# Altium footprint library MYS-Library.PcbLib: 94 footprints (part 6 of 6)
Each footprint in its own frame and in the unit in brackets; x right, y up, seen from the top. Pads: shape width x height; smd on the part's side, far side on the other; paste and mask are expansions set on the pad; w line width, h text height; cw(c..) or ccw(c..) is an arc to the next point about the centre after c.
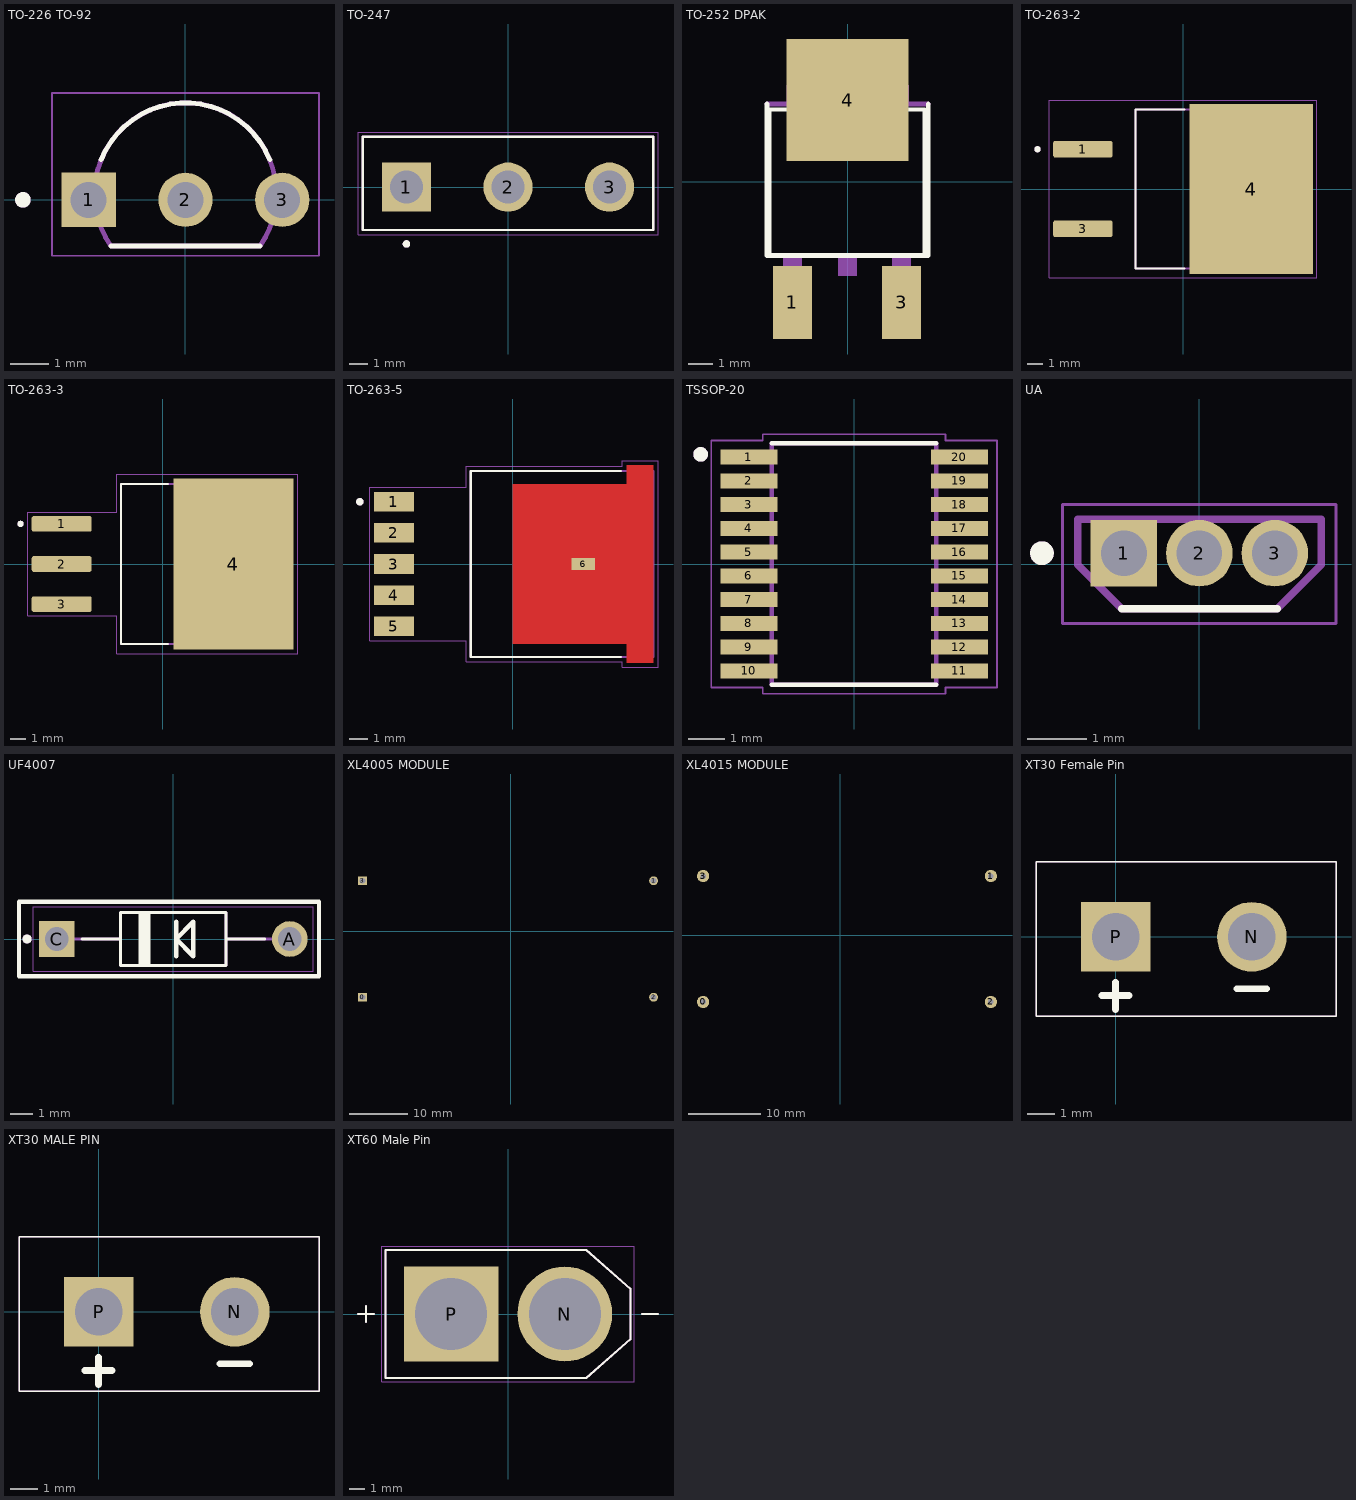
[diagram p5: the footprints below, top view; thin cyan lines are the x and y axes]

## TO-226 TO-92 [mm]
pads (3):
  rect 1.4x1.4 / inner round 1.4 / far side rect 1.4x1.4 hole 0.93: 1(-2.5,0)
  round 1.4 hole 0.93: 2(0,0) 3(2.5,0)
Top Overlay:
  circle w0.2: c-4.2,0 r0.1
  lines w0.127: -2.179,1.035 cw(c0,0.155) 2.179,1.035 ; -1.924,-1.195 1.924,-1.195 -1.924,-1.195
Mechanical 13:
  circle w0.2: c-4.2,0 r0.1
  lines w0.127: -1.925,-1.193 cw(c0,0.155) 1.925,-1.193 ; -1.924,-1.195 1.924,-1.195
Mechanical 15:
  lines w0.05: -3.45,-1.445 -3.45,2.755 3.45,2.755 3.45,-1.445 -3.45,-1.445
3D body "BC547B.STEP": height 8.09, standoff -9.01, extent -2.74,-1.27 2.74,2.33

## TO-247 [mm]
pads (3):
  rect 2.64x2.64 hole 1.76: 1(-5.45,0)
  round 2.64 hole 1.76: 2(0,0) 3(5.45,0)
Top Overlay:
  circle w0.2: c-5.45,-3.05 r0.1
  lines w0.127: -7.8,-2.3 -7.8,2.7 7.8,2.7 7.8,-2.3 -7.8,-2.3
Mechanical 13:
  circle w0.2: c-5.45,-3.05 r0.1
  lines w0.127: -7.8,-2.3 -7.8,2.7 7.8,2.7 7.8,-2.3 -7.8,-2.3
Mechanical 15:
  lines w0.05: -8.05,-2.55 -8.05,2.95 8.05,2.95 8.05,-2.55 -8.05,-2.55
3D body "step_temp.STEP": height 25.1, standoff -10, extent -7.8,-2.3 7.8,2.7

## TO-252 DPAK [mil]
pads (3):
  rect 63x118 smd: 1(-89,-194) 3(87,-194)
  rect 196.85x196.85 smd: 4(0,132)
Top Overlay:
  lines w6: -97,117 -126,117 -126,-119 124,-119 124,117 97,117
  lines w8: -129.92,125.98 -129.92,-118.11 129.92,-118.11 129.92,125.98
Mechanical 13:
  region: 98.43,155.51 98.43,125.98 -98.43,125.98 -98.43,155.51 -64.96,177.17 64.96,177.17
  region: 102,-226 72,-226 72,-121 102,-121
  region: 15,-151 -15,-151 -15,-121 15,-121
  region: -74,-226 -104,-226 -104,-121 -74,-121
  region: 102,-226 72,-226 72,-121 102,-121
  region: 15,-151 -15,-151 -15,-121 15,-121
  region: -74,-226 -104,-226 -104,-121 -74,-121
  lines w6: -97,117 97,117
  lines w8: -129.92,125.98 129.92,125.98
  text "2" at -8,-112 h24
  text "3" at 78,-112 h24
  text "4" at -13,72.5 h24
  text "1" at -95,-112 h24
3D body "step_temp.STEP": height 99, standoff 0, extent -128.75,-195 128.75,195

## TO-263-2 [mm]
pads (3):
  rrect25% 3.78x1.06 smd: 1(-6.4,2.54) 3(-6.4,-2.54)
  rect 7.88x10.84 smd paste-6: 4(4.35,0)
Top Overlay:
  circle w0.2: c-9.29,2.54 r0.1
  lines w0.127: 0.09,-5.08 -3.043,-5.08 -3.043,5.08 0.09,5.08
Top Paste:
  region: 7.74,3.9 6.22,3.9 6.22,5.15 7.74,5.15
  region: 5.11,3.9 3.59,3.9 3.59,5.15 5.11,5.15
  region: 2.48,3.9 0.96,3.9 0.96,5.15 2.48,5.15
  region: 7.74,2.09 6.22,2.09 6.22,3.34 7.74,3.34
  region: 5.11,2.09 3.59,2.09 3.59,3.34 5.11,3.34
  region: 2.48,2.09 0.96,2.09 0.96,3.34 2.48,3.34
  region: 7.74,-5.15 6.22,-5.15 6.22,-3.9 7.74,-3.9
  region: 5.11,-5.15 3.59,-5.15 3.59,-3.9 5.11,-3.9
  region: 2.48,-5.15 0.96,-5.15 0.96,-3.9 2.48,-3.9
  region: 7.74,-3.34 6.22,-3.34 6.22,-2.09 7.74,-2.09
  region: 5.11,-3.34 3.59,-3.34 3.59,-2.09 5.11,-2.09
  region: 2.48,-3.34 0.96,-3.34 0.96,-2.09 2.48,-2.09
  region: 7.74,-1.53 6.22,-1.53 6.22,-0.28 7.74,-0.28
  region: 5.11,-1.53 3.59,-1.53 3.59,-0.28 5.11,-0.28
  region: 2.48,-1.53 0.96,-1.53 0.96,-0.28 2.48,-0.28
  region: 7.74,0.28 6.22,0.28 6.22,1.53 7.74,1.53
  region: 5.11,0.28 3.59,0.28 3.59,1.53 5.11,1.53
  region: 2.48,0.28 0.96,0.28 0.96,1.53 2.48,1.53
Mechanical 13:
  circle w0.2: c-9.29,2.54 r0.1
  lines w0.127: -3.043,-5.08 5.973,-5.08 5.973,5.08 -3.043,5.08 -3.043,-5.08
Mechanical 15:
  lines w0.05: -8.54,-5.67 8.54,-5.67 8.54,5.67 -8.54,5.67 -8.54,-5.67
3D body "step_temp.STEP": height 4.83, standoff -0.25, extent -7.62,-5.08 7.62,5.08

## TO-263-3 [mm]
pads (4):
  rrect25% 3.79x0.99 smd: 1(-6.4,2.54) 2(-6.4,0) 3(-6.4,-2.54)
  rect 7.62x10.84 smd paste-6: 4(4.48,0)
Top Overlay:
  circle w0.2: c-9,2.54 r0.1
  lines w0.127: 0.35,-5.08 -2.648,-5.08 -2.648,5.08 0.35,5.08
Top Paste:
  region: 2.665,-5.13 1.215,-5.13 1.215,-3.87 2.665,-3.87
  region: 2.665,-3.33 1.215,-3.33 1.215,-2.07 2.665,-2.07
  region: 2.665,-1.53 1.215,-1.53 1.215,-0.27 2.665,-0.27
  region: 2.665,3.87 1.215,3.87 1.215,5.13 2.665,5.13
  region: 2.665,2.07 1.215,2.07 1.215,3.33 2.665,3.33
  region: 2.665,0.27 1.215,0.27 1.215,1.53 2.665,1.53
  region: 7.745,-5.13 6.295,-5.13 6.295,-3.87 7.745,-3.87
  region: 7.745,-3.33 6.295,-3.33 6.295,-2.07 7.745,-2.07
  region: 7.745,-1.53 6.295,-1.53 6.295,-0.27 7.745,-0.27
  region: 7.745,3.87 6.295,3.87 6.295,5.13 7.745,5.13
  region: 7.745,2.07 6.295,2.07 6.295,3.33 7.745,3.33
  region: 7.745,0.27 6.295,0.27 6.295,1.53 7.745,1.53
  region: 5.205,-5.13 3.755,-5.13 3.755,-3.87 5.205,-3.87
  region: 5.205,-3.33 3.755,-3.33 3.755,-2.07 5.205,-2.07
  region: 5.205,-1.53 3.755,-1.53 3.755,-0.27 5.205,-0.27
  region: 5.205,3.87 3.755,3.87 3.755,5.13 5.205,5.13
  region: 5.205,2.07 3.755,2.07 3.755,3.33 5.205,3.33
  region: 5.205,0.27 3.755,0.27 3.755,1.53 5.205,1.53
Mechanical 13:
  circle w0.2: c-9,2.54 r0.1
  lines w0.127: -2.648,-5.08 -2.648,5.08 6.373,5.08 6.373,-5.08 -2.648,-5.08
Mechanical 15:
  lines w0.05: -8.545,-3.285 -2.898,-3.285 -2.898,-5.67 8.54,-5.67 8.54,5.67 -2.898,5.67 -2.898,3.285 -8.545,3.285 -8.545,-3.285
3D body "LM7812S_NOPB.STEP": height 4.83, standoff -0.25, extent -7.112,-5.08 8.128,5.08

## TO-263-5 [mm]
pads (6):
  rect 2.16x1.07 smd: 1(-6.5,3.4) 2(-6.5,1.7) 3(-6.5,0) 4(-6.5,-1.7) 5(-6.5,-3.4)
  rect 1.27x0.635 smd paste-2 mask+0: 6(3.835,0)
Top Layer:
  region: 7.67,-5.4 6.2,-5.4 6.2,-4.35 0,-4.35 0,4.35 6.2,4.35 6.2,5.4 7.67,5.4
Top Overlay:
  circle w0.2: c-8.365,3.4 r0.1
  lines w0.127: 5.885,-5.08 -2.3,-5.08 -2.3,5.08 5.885,5.08
Top Paste:
  region: 7.035,0.88 4.435,0.88 4.435,3.48 7.035,3.48
  region: 3.235,-3.48 0.635,-3.48 0.635,-0.88 3.235,-0.88
  region: 7.035,-3.48 4.435,-3.48 4.435,-0.88 7.035,-0.88
  region: 3.235,0.88 0.635,0.88 0.635,3.48 3.235,3.48
Top Solder:
  region: 7.77,-5.5 6.1,-5.5 6.1,-4.45 -0.1,-4.45 -0.1,4.45 6.1,4.45 6.1,5.5 7.77,5.5
Mechanical 13:
  circle w0.2: c-8.365,3.4 r0.1
  lines w0.127: -2.3,-5.08 -2.3,5.08 7.67,5.08 7.67,-5.08 -2.3,-5.08
Mechanical 15:
  lines w0.05: -7.83,-4.185 -7.83,4.185 -2.55,4.185 -2.55,5.33 5.955,5.33 5.955,5.65 7.92,5.65 7.92,-5.65 5.955,-5.65 5.955,-5.33 -2.55,-5.33 -2.55,-4.185 -7.83,-4.185
3D body "LM2596S-3.3.STEP": height 4.65, standoff -0.15, extent -7.175,-5.08 7.175,5.08

## TSSOP-20 [mm]
pads (20):
  rect 1.56x0.41 smd: 1(-2.88,2.925) 2(-2.88,2.275) 3(-2.88,1.625) 4(-2.88,0.975) 5(-2.88,0.325) 6(-2.88,-0.325) 7(-2.88,-0.975) 8(-2.88,-1.625) 9(-2.88,-2.275) 10(-2.88,-2.925) 11(2.88,-2.925) 12(2.88,-2.275) 13(2.88,-1.625) 14(2.88,-0.975) 15(2.88,-0.325) 16(2.88,0.325) 17(2.88,0.975) 18(2.88,1.625) 19(2.88,2.275) 20(2.88,2.925)
Top Overlay:
  circle w0.2: c-4.2,3 r0.1
  lines w0.127: -2.25,-3.3 2.25,-3.3 ; -2.25,3.3 2.25,3.3
Mechanical 13:
  circle w0.2: c-4.2,3 r0.1
  lines w0.127: -2.25,-3.3 -2.25,3.3 2.25,3.3 2.25,-3.3 -2.25,-3.3
Mechanical 15:
  lines w0.05: -3.91,-3.38 -3.91,3.38 -2.5,3.38 -2.5,3.55 2.5,3.55 2.5,3.38 3.91,3.38 3.91,-3.38 2.5,-3.38 2.5,-3.55 -2.5,-3.55 -2.5,-3.38 -3.91,-3.38
3D body "step_temp.STEP": height 0.53, standoff -0.67, extent -3.2,-3.25 3.2,3.25

## UA [mm]
pads (3):
  rect 1.12x1.12 / inner round 1.12 / far side rect 1.12x1.12 hole 0.77: 1(-1.27,0.182)
  round 1.12 hole 0.77: 2(0,0.182) 3(1.27,0.182)
Top Overlay:
  circle w0.2: c-2.65,0.182 r0.1
  lines w0.127: -1.308,-0.75 1.308,-0.75
Mechanical 13:
  circle w0.2: c-2.65,0.182 r0.1
  lines w0.127: -2.05,-0.015 -2.05,0.75 2.05,0.75 2.05,-0.015 1.308,-0.75 -1.308,-0.75 -2.05,-0.015
Mechanical 15:
  lines w0.05: -2.3,-1 -2.3,1 2.3,1 2.3,-1 -2.3,-1
3D body "step_temp.STEP": height 4.95, standoff -13.25, extent -2.05,-0.933 2.05,0.567

## UF4007 [mm]
pads (2):
  round 1.59 hole 1.06: A(5.18,0)
  rect 1.59x1.59 hole 1.06: C(-5.18,0)
Top Overlay:
  circle w0.2: c-6.5,0 r0.1
  region: -1.016,-1.143 -1.526,-1.143 -1.526,1.143 -1.016,1.143
  lines w0.127: -4.065,0 -2.35,0 ; 4.065,0 2.35,0 ; -2.35,0 -2.35,-1.175 2.35,-1.175 2.35,0 ; -2.35,0 -2.35,1.175 2.35,1.175 2.35,0
  lines w0.2: 0.127,-0.762 0.127,0.762 ; -6.858,-1.651 6.477,-1.651 6.477,1.651 -6.858,1.651 -6.858,-1.651 ; 0.127,0 0.889,-0.762 0.889,0.762 0.127,0
Mechanical 13:
  circle w0.2: c-6.5,0 r0.1
  lines w0.127: -5.18,0 -2.35,0 ; 5.18,0 2.35,0 ; -2.35,0 -2.35,-1.175 2.35,-1.175 2.35,0 ; -2.35,0 -2.35,1.175 2.35,1.175 2.35,0
Mechanical 15:
  lines w0.05: -6.225,-1.425 6.225,-1.425 6.225,1.425 -6.225,1.425 -6.225,-1.425
3D body "UF4007.STEP": height 3.8, standoff -14.3, extent -5.65,-1.4 5.65,1.4

## XL4005 MODULE [mil]
pads (4):
  rect 60x60 hole 40.16: 0(-1003.5,-445) 3(-1003.5,342.4)
  round 60 hole 40.16: 1(965,342.4) 2(965,-445)
3D body "XL4015_MODELO_PISTAS.step": height 768.7, standoff 187.84, extent -1080.7,-522.92 1045.29,422.5
3D body "zl201-1_p2-54_l2-54_w2-54_h8-89.stp": height 350, standoff -120, extent -1053.5,292.4 -953.5,392.4
3D body "zl201-1_p2-54_l2-54_w2-54_h8-89.stp": height 350, standoff -120, extent -1053.5,-500 -953.5,-400
3D body "zl201-1_p2-54_l2-54_w2-54_h8-89.stp": height 350, standoff -120, extent 915,287.4 1015,387.4
3D body "zl201-1_p2-54_l2-54_w2-54_h8-89.stp": height 350, standoff -120, extent 915,-500 1015,-400

## XL4015 MODULE [mm]
pads (4):
  round 1.7 hole 0.762: 0(-19.05,-9.245) 1(20.95,8.255) 2(20.95,-9.245) 3(-19.05,8.255)
3D body "zl201-1_p2-54_l2-54_w2-54_h8-89.stp": height 8.89, standoff -3.05, extent -20.32,6.985 -17.78,9.525
3D body "zl201-1_p2-54_l2-54_w2-54_h8-89.stp": height 8.89, standoff -3.05, extent -20.32,-10.515 -17.78,-7.975
3D body "zl201-1_p2-54_l2-54_w2-54_h8-89.stp": height 8.89, standoff -3.05, extent 19.68,-10.515 22.22,-7.975
3D body "zl201-1_p2-54_l2-54_w2-54_h8-89.stp": height 8.89, standoff -3.05, extent 19.68,6.985 22.22,9.525
3D body "XL4005_MODELO_3D_1.step": height 18.35, standoff 5.24, extent -20.909,-11.39 23.091,10.252

## XT30 Female Pin [mm]
pads (2):
  round 2.55 hole 1.75: N(5,0)
  rect 2.55x2.55 hole 1.75: P(0,0)
Top Overlay:
  lines w0.05: -2.921,-2.922 -2.921,2.761 8.088,2.761 8.088,-2.922 -2.921,-2.922
  lines w0.254: -0.508,-2.159 0.492,-2.159 ; 0,-2.667 0,-1.667 ; 4.445,-1.905 5.545,-1.905
Mechanical 15:
  lines w0.05: -2.921,-2.922 -2.921,2.761 8.088,2.761 8.088,-2.922 -2.921,-2.922
3D body "1.STEP": height 12.6, standoff -3, extent -2.812,-2.667 7.638,2.583

## XT30 MALE PIN [mm]
pads (2):
  round 2.55 hole 1.75: N(5,0)
  rect 2.55x2.55 hole 1.75: P(0,0)
Top Overlay:
  lines w0.05: -2.921,-2.922 -2.921,2.761 8.088,2.761 8.088,-2.922 -2.921,-2.922
  lines w0.254: -0.508,-2.159 0.492,-2.159 ; 0,-2.667 0,-1.667 ; 4.445,-1.905 5.545,-1.905
Mechanical 15:
  lines w0.05: -2.921,-2.922 -2.921,2.761 8.088,2.761 8.088,-2.922 -2.921,-2.922
3D body "2.STEP": height 13, standoff -2.5, extent -2.685,-2.71 7.765,2.54

## XT60 Male Pin [mm]
pads (2):
  round 6 hole 4.55: N(3.6,0)
  rect 6x6 / inner round 6 / far side rect 6x6 hole 4.55: P(-3.6,0)
Top Overlay:
  lines w0.127: -9.5,0 -8.5,0 ; -9,-0.5 -9,0.5 ; 8.5,0 9.5,0 ; -7.75,-4.05 4.95,-4.05 7.75,-1.6 7.75,1.6 4.95,4.05 -7.75,4.05 -7.75,-4.05
Mechanical 13:
  lines w0.127: -9.5,0 -8.5,0 ; -9,-0.5 -9,0.5 ; 8.5,0 9.5,0 ; -7.75,-4.05 4.95,-4.05 7.75,-1.6 7.75,1.6 4.95,4.05 -7.75,4.05 -7.75,-4.05
Mechanical 15:
  lines w0.05: -8,-4.3 -8,4.3 8,4.3 8,-4.3 -8,-4.3
3D body "step_temp.STEP": height 16.5, standoff -4, extent -7.75,-4.05 7.75,4.05